# Altium footprint library Module.PcbLib: 48 footprints (part 1 of 3)
Each footprint in its own frame and in the unit in brackets; x right, y up, seen from the top. Pads: shape width x height; smd on the part's side, far side on the other; paste and mask are expansions set on the pad; w line width, h text height; cw(c..) or ccw(c..) is an arc to the next point about the centre after c.
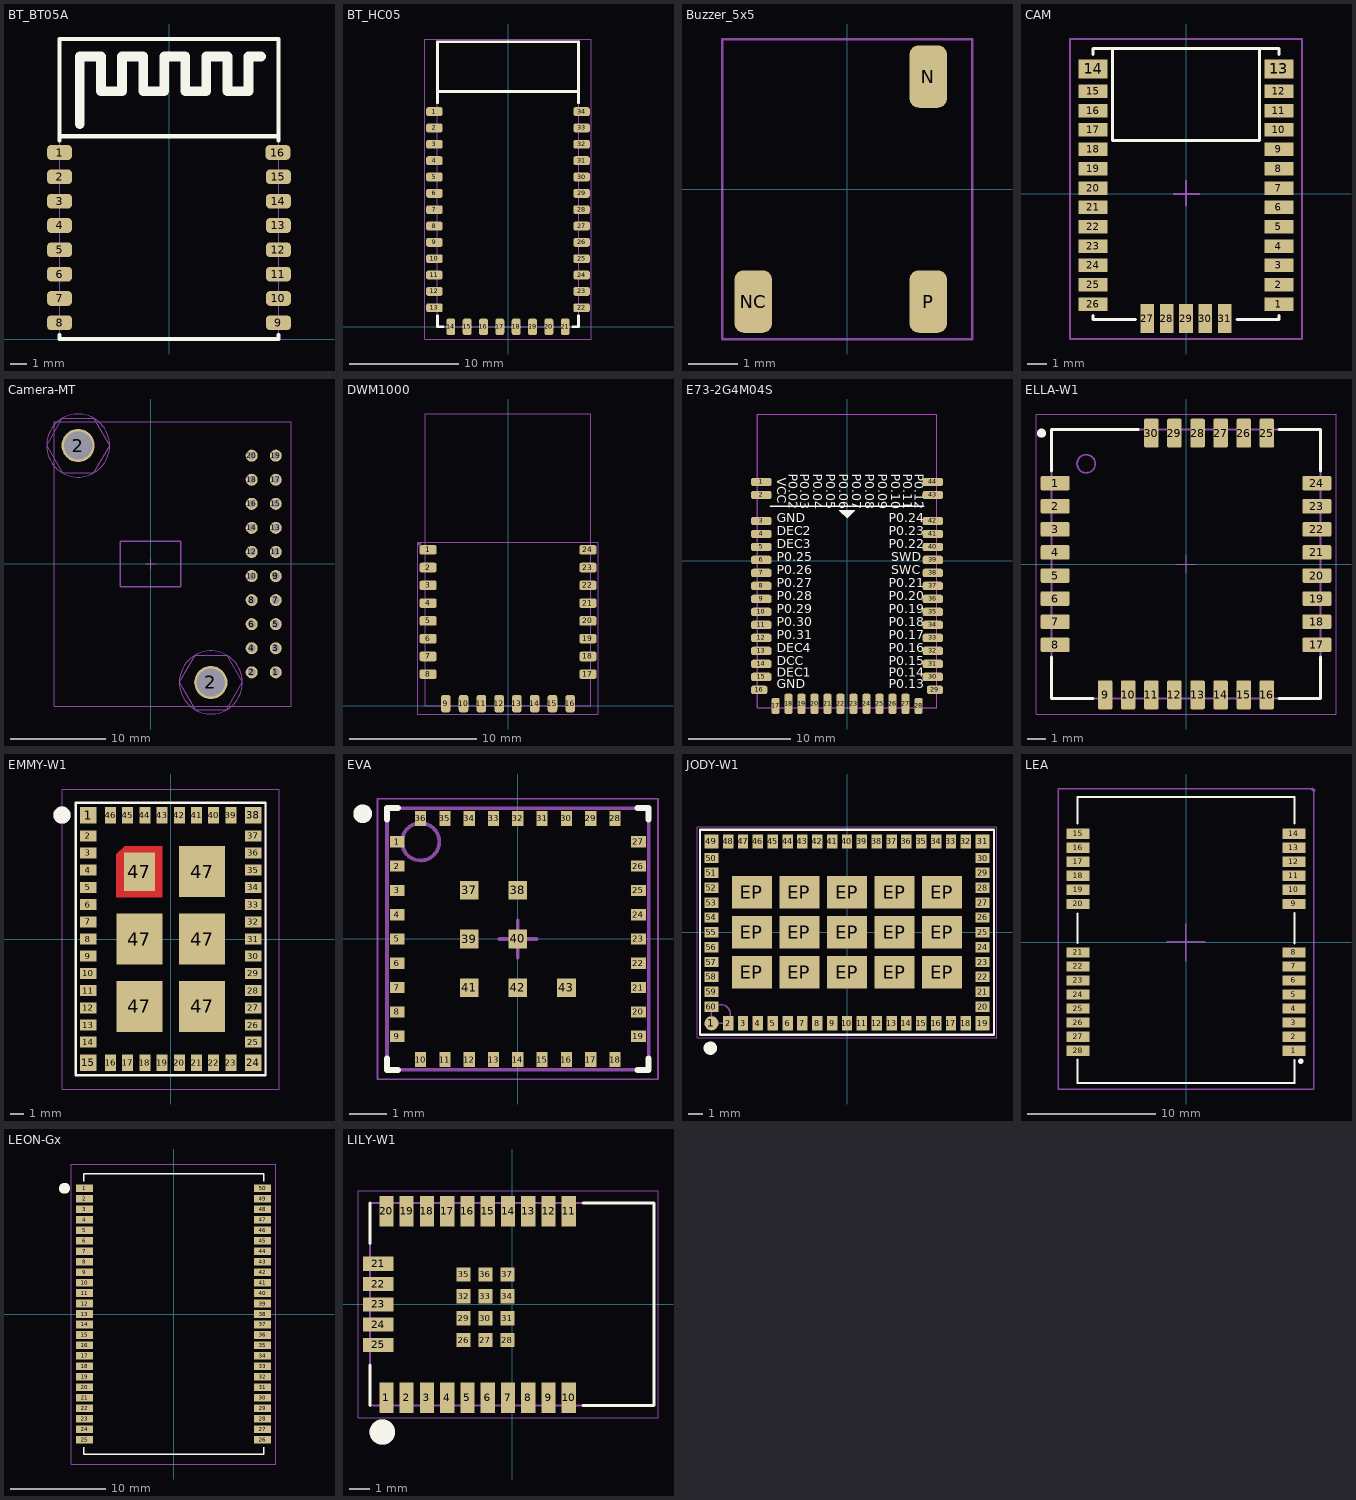
[diagram p0: the footprints below, top view; thin cyan lines are the x and y axes]

## BT_BT05A [mm]
pads (16):
  rrect50% 1.524x0.9 smd: 1(-6.754,11.5) 2(-6.754,10) 3(-6.754,8.5) 4(-6.754,7) 5(-6.754,5.5) 6(-6.754,4) 7(-6.754,2.5) 8(-6.754,1) 9(6.746,1) 10(6.746,2.5) 11(6.746,4) 12(6.746,5.5) 13(6.746,7) 14(6.746,8.5) 15(6.746,10) 16(6.712,11.5)
Top Overlay:
  lines w0.254: -6.75,0.25 -6.75,0 6.75,0 6.75,0.25 ; -6.75,12.25 -6.75,12.5 ; 6.75,12.25 6.75,12.5 ; -6.75,12.5 -6.75,18.5 6.75,18.5 6.75,12.5 ; -6.75,12.5 6.75,12.5
  lines w0.6: -5.5,13.25 -5.5,17.426 -4.2,17.426 -4.2,15.282 -2.9,15.282 -2.9,17.426 -1.6,17.426 -1.6,15.282 -0.3,15.282 -0.3,17.426 1,17.426 1,15.282 2.3,15.282 2.3,17.426 3.6,17.426 3.6,15.282 4.9,15.282 4.9,17.426 5.676,17.426
Mechanical 13:
  lines w0.051: -6.75,12.5 6.75,12.5 ; -6.75,0 6.75,0 6.75,18.5 -6.75,18.5 -6.75,0
T-Component:
  lines w0.051: -6.75,0 6.75,0 6.75,18.5 -6.75,18.5 -6.75,0

## BT_HC05 [mil]
pads (34):
  rrect50% 60x32 smd: 1(-265.91,777.56) 2(-265.91,718.5) 3(-265.91,659.45) 4(-265.91,600.39) 5(-265.91,541.34) 6(-265.91,482.28) 7(-265.91,423.23) 8(-265.91,364.17) 9(-265.91,305.12) 10(-265.91,246.06) 11(-265.91,187.01) 12(-265.91,127.95) 13(-265.91,68.9) 22(265.91,68.9) 23(265.91,127.95) 24(265.91,187.01) 25(265.91,246.06) 26(265.91,305.12) 27(265.91,364.17) 28(265.91,423.23) 29(265.91,482.28) 30(265.91,541.34) 31(265.91,600.39) 32(265.91,659.45) 33(265.91,718.5) 34(265.91,777.56)
  rrect50% 32x60 smd: 14(-206.69,0) 15(-147.64,0) 16(-88.58,0) 17(-29.53,0) 18(29.53,0) 19(88.58,0) 20(147.64,0) 21(206.69,0)
Top Overlay:
  lines w10: -255,40 -255,0 -235,0 ; -255,810 -255,850 ; 235,0 255,0 255,40 ; 255,810 255,850 ; -255,850 255,850 ; -255,850 -255,1030 255,1030 255,850
Mechanical 13:
  lines w2: -255.91,850.39 255.91,850.39 ; -255.91,0 -255.91,1039.37 255.91,1039.37 255.91,0 -255.91,0
T-Component:
  lines w2: -300,-44 -300,1040 300,1040 300,-44 -300,-44
3D body "User Library-Bluetooth HC-06_.STEP": height 92.52, standoff 0, extent -275.98,0 275.98,1102.76

## Buzzer_5x5 [mil]
pads (3):
  rrect50% 30x50 smd: N(65,90) NC(-75,-90) P(65,-90)
T-Component:
  lines w2: -100,-120 -100,120 100,120 100,-120 -100,-120
  text ".Designator" at -39.37,-3.94 h50
3D body "css-0575b-smt.stp": height 106.3, standoff 0, extent -98.44,-98.43 98.41,98.43

## CAM [mm] "u-blox CAM GNSS antenna module"
pads (31):
  rect 1.5x0.7 smd: 1(4.8,-5.7) 2(4.8,-4.7) 3(4.8,-3.7) 4(4.8,-2.7) 5(4.8,-1.7) 6(4.8,-0.7) 7(4.8,0.3) 8(4.8,1.3) 9(4.8,2.3) 10(4.8,3.3) 11(4.8,4.3) 12(4.8,5.3) 15(-4.8,5.3) 16(-4.8,4.3) 17(-4.8,3.3) 18(-4.8,2.3) 19(-4.8,1.3) 20(-4.8,0.3) 21(-4.8,-0.7) 22(-4.8,-1.7) 23(-4.8,-2.7) 24(-4.8,-3.7) 25(-4.8,-4.7) 26(-4.8,-5.7)
  rect 1.5x1 smd: 13(4.8,6.45) 14(-4.8,6.45)
  rect 0.7x1.5 smd: 27(-2,-6.45) 28(-1,-6.45) 29(0,-6.45) 30(1,-6.45) 31(2,-6.45)
Top Overlay:
  lines w0.16: -4.8,-6.3 -4.8,-6.5 -2.6,-6.5 ; -4.8,7.2 -4.8,7.5 4.8,7.5 4.8,7.2 ; -3.8,7.5 -3.8,2.75 3.8,2.75 3.8,7.5 ; 2.63,-6.5 4.45,-6.5 4.8,-6.5 4.8,-6.3
Mechanical 13:
  text ".Designator" at -3.818,9.56 h1
B-Component:
  lines w0.1: -0.619,-0.003 -0.001,-0.003 ; -0.001,-0.615 -0.001,-0.003 ; -0.001,0.662 -0.001,-0.003 ; 0.696,-0.003 -0.001,-0.003 ; -6,-7.5 6,-7.5 6,8 -6,8 -6,-7.5
Multi-Layer:
  pour cut-out: -3.8,7.5 -3.8,2.75 3.8,2.75 3.8,7.5
3D body "CAM (STEP-AP214).STEP": height 1.97, standoff -0.04, extent -4.8,-6.5 4.8,7.5

## Camera-MT [mil]
pads (22):
  round 50 hole 31: 1(520,-450) 2(420,-450) 3(520,-350) 4(420,-350) 5(520,-250) 6(420,-250) 7(520,-150) 8(420,-150) 9(520,-50) 10(420,-50) 11(520,50) 12(420,50) 13(520,150) 14(420,150) 15(520,250) 16(420,250) 17(520,350) 18(420,350) 19(520,450) 20(420,450)
  round 137.8 hole 118.11 mask+0: 2(-300.94,492.13) 2(250.24,-492.13)
Mechanical 13:
  circle w2: c-300.94,492.13 r130.98
  circle w2: c250.24,-492.13 r130.98
  lines w2: -19.69,0 19.68,0 ; 0,-19.69 0,19.68 ; -431.92,492.13 -366.43,605.55 -235.46,605.55 -169.97,492.12 -235.46,378.7 -366.43,378.7 -431.92,492.13 ; -399.37,-590.55 -399.37,590.55 584.88,590.55 584.88,-590.55 -399.37,-590.55 ; 119.26,-492.13 184.75,-378.7 315.72,-378.7 381.21,-492.13 315.72,-605.56 184.75,-605.56 119.26,-492.13
  lines w6: -126,-94 126,-94 126,94 -126,94 -126,-94
B-Component:
  lines w1: 510,-450 530,-450 ; 510,-350 530,-350 ; 510,-250 530,-250 ; 510,-150 530,-150 ; 510,-50 530,-50 ; 510,50 530,50 ; 510,150 530,150 ; 510,250 530,250 ; 510,350 530,350 ; 510,450 530,450 ; 520,-460 520,-440 ; 520,-360 520,-340 ; 520,-260 520,-240 ; 520,-160 520,-140 ; 520,-60 520,-40 ; 520,40 520,60 ; 520,140 520,160 ; 520,240 520,260 ; 520,340 520,360 ; 520,440 520,460
3D body "Camera-MT__Pcb.step": height 528.82, standoff 114.65, extent -399.36,-590.55 584.89,590.55
3D body "female_header_a-bl254-dg-g04d.stp": height 334.65, standoff -125.98, extent 371.57,-4.91 568.42,204.93
3D body "female_header_a-bl254-dg-g06d.stp": height 334.65, standoff -125.98, extent 371.57,195.08 568.42,504.93
3D body "female_header_a-bl254-dg-g06d.stp": height 334.65, standoff -125.98, extent 371.57,-304.92 568.42,4.93
3D body "female_header_a-bl254-dg-g04d.stp": height 334.65, standoff -125.98, extent 371.57,-504.91 568.42,-295.07

## DWM1000 [mil]
pads (24):
  rrect50% 54x30 smd: 1(-248,484.25) 2(-248,429.13) 3(-248,374.02) 4(-248,318.9) 5(-248,263.78) 6(-248,208.66) 7(-248,153.54) 8(-248,98.43) 17(248,98.43) 18(248,153.54) 19(248,208.66) 20(248,263.78) 21(248,318.9) 22(248,374.02) 23(248,429.13) 24(248,484.25)
  rrect50% 30x54 smd: 9(-192.91,7) 10(-137.8,7) 11(-82.68,7) 12(-27.56,7) 13(27.56,7) 14(82.68,7) 15(137.8,7) 16(192.91,7)
Mechanical 13:
  lines w1.97: -255.91,905.51 -255.91,0 255.91,0 255.91,905.51
  lines w2: -255.91,905.51 255.91,905.51
T-Component:
  region: -280,508 -270,508 -270,503 -270,502.01 -270.76,500.17 -272.17,498.76 -274.01,498 -275,498 -280,498
  lines w2: -280,-25 -280,508 280,508 280,-25 -280,-25
  text ".Designator" at -39.37,246.06 h50
3D body "DWM1000 Module.STEP": height 114.17, standoff -0.39, extent -255.9,0 255.9,905.51

## E73-2G4M04S [mil]
pads (44):
  rrect50% 78x32 smd: 1(-330,303.74) 2(-330,253.74) 3(-330,153.74) 4(-330,103.74) 5(-330,53.74) 6(-330,3.74) 7(-330,-46.26) 8(-330,-96.26) 9(-330,-146.26) 10(-330,-196.26) 11(-330,-246.26) 12(-330,-296.26) 13(-330,-346.26) 14(-330,-396.26) 15(-330,-446.26) 30(330,-446.26) 31(330,-396.26) 32(330,-346.26) 33(330,-296.26) 34(330,-246.26) 35(330,-196.26) 36(330,-146.26) 37(330,-96.26) 38(330,-46.26) 39(330,3.74) 40(330,53.74) 41(330,103.74) 42(330,153.74) 43(330,253.74) 44(330,303.74)
  rrect50% 62.99x32 smd: 16(-338,-496.26)
  rrect50% 32x62 smd: 17(-275,-558) 28(275,-558)
  rrect50% 32x78 smd: 18(-225,-550) 19(-175,-550) 20(-125,-550) 21(-75,-550) 22(-25,-550) 23(25,-550) 24(75,-550) 25(125,-550) 26(175,-550) 27(225,-550)
  rrect50% 62x32 smd: 29(338,-496.26)
Top Overlay:
  region: -30,195 30,195 0,165
  lines w2: -30,195 30,195 0,165 -30,195
  lines w6: -295,210 295,210
  text "P0.13" at 160,-502.26 h60
  text "P0.14" at 160,-457.26 h60
  text "P0.15" at 160,-412.26 h60
  text "P0.16" at 160,-362.26 h60
  text "P0.17" at 160,-312.26 h60
  text "P0.18" at 160,-262.26 h60
  text "P0.19" at 160,-212.26 h60
  text "P0.20" at 160,-162.26 h60
  text "P0.21" at 160,-112.26 h60
  text "SWC" at 170,-62.26 h60
  text "SWD" at 170,-12.26 h60
  text "P0.22" at 160,37.74 h60
  text "P0.23" at 160,87.74 h60
  text "P0.24" at 160,137.74 h60
  text "GND" at -270,-502.26 h60
  text "DEC1" at -270,-457.26 h60
  text "DCC" at -270,-412.26 h60
  text "DEC4" at -270,-362.26 h60
  text "P0.31" at -270,-312.26 h60
  text "P0.30" at -270,-262.26 h60
  text "P0.29" at -270,-212.26 h60
  text "P0.28" at -270,-162.26 h60
  text "P0.27" at -270,-112.26 h60
  text "P0.25" at -270,-12.26 h60
  text "DEC3" at -270,37.74 h60
  text "GND" at -270,137.74 h60
  text "DEC2" at -270,87.74 h60
  text "P0.26" at -270,-62.26 h60
  text "P0.02" at -236,335 h60
  text "P0.03" at -191,335 h60
  text "P0.04" at -141,335 h60
  text "P0.05" at -91,335 h60
  text "P0.06" at -41,335 h60
  text "P0.07" at 9,335 h60
  text "P0.08" at 59,335 h60
  text "P0.09" at 109,335 h60
  text "P0.10" at 159,335 h60
  text "P0.11" at 204,335 h60
  text "VCC" at -281,320 h60
  text "P0.12" at 249,335 h60
Keep-Out Layer:
  lines w3.94: -344.49,-564.96 -344.49,564.96 344.49,564.96 344.49,-564.96 -344.49,-564.96
Mechanical 13:
  lines w2: -345,-565 345,-565 345,565 -345,565 -345,-565
T-Component:
  lines w2: -345,-565 -345,565 345,565 345,-565 -345,-565
  text ".Designator" at -40,-5 h50

## ELLA-W1 [mm] "IEEE 802.11a/b/g/n Wi-Fi, Bluetooth 3.0+HS Module"
height 2
pads (30):
  rrect25% 1.6x0.8 smd: 1(-7.2,4.445) 2(-7.2,3.175) 3(-7.2,1.905) 4(-7.2,0.635) 5(-7.2,-0.635) 6(-7.2,-1.905) 7(-7.2,-3.175) 8(-7.2,-4.445) 17(7.2,-4.445) 18(7.2,-3.175) 19(7.2,-1.905) 20(7.2,-0.635) 21(7.2,0.635) 22(7.2,1.905) 23(7.2,3.175) 24(7.2,4.445)
  rrect25% 0.8x1.6 smd: 9(-4.445,-7.2) 10(-3.175,-7.2) 11(-1.905,-7.2) 12(-0.635,-7.2) 13(0.635,-7.2) 14(1.905,-7.2) 15(3.175,-7.2) 16(4.445,-7.2) 25(4.445,7.2) 26(3.175,7.2) 27(1.905,7.2) 28(0.635,7.2) 29(-0.635,7.2) 30(-1.905,7.2)
Top Overlay:
  circle w0.4: c-7.95,7.2 r0.05
  lines w0.16: -7.4,-5.125 -7.4,-7.4 -5.125,-7.4 ; -7.4,5.125 -7.4,7.4 -2.625,7.4 ; 5.125,-7.4 7.4,-7.4 7.4,-5.125 ; 5.125,7.4 7.4,7.4 7.4,5.125
Mechanical 13:
  circle w0.1: c-5.489,5.512 r0.499
  lines w0.1: -7.4,4.695 -7.4,7.4 -2.155,7.4 ccw(c-1.905,7.4) -1.655,7.4 -0.885,7.4 ccw(c-0.635,7.4) -0.385,7.4 0.385,7.4 ccw(c0.635,7.4) 0.885,7.4 1.655,7.4 ccw(c1.905,7.4) 2.155,7.4 2.925,7.4 ccw(c3.175,7.4) 3.425,7.4 4.195,7.4 ccw(c4.445,7.4) 4.695,7.4 ; -7.4,4.695 cw(c-7.4,4.445) -7.4,4.195 -7.4,3.425 cw(c-7.4,3.175) -7.4,2.925 -7.4,2.155 cw(c-7.4,1.905) -7.4,1.655 -7.4,0.885 cw(c-7.4,0.635) -7.4,0.385 -7.4,-0.385 cw(c-7.4,-0.635) -7.4,-0.885 -7.4,-1.655 cw(c-7.4,-1.905) -7.4,-2.155 -7.4,-2.925 cw(c-7.4,-3.175) -7.4,-3.425 -7.4,-4.195 cw(c-7.4,-4.445) -7.4,-4.695 -7.4,-7.4 -4.695,-7.4 cw(c-4.445,-7.4) -4.195,-7.4 -3.425,-7.4 cw(c-3.175,-7.4) -2.925,-7.4 -2.155,-7.4 cw(c-1.905,-7.4) -1.655,-7.4 -0.885,-7.4 cw(c-0.635,-7.4) -0.385,-7.4 0.385,-7.4 cw(c0.635,-7.4) 0.885,-7.4 1.655,-7.4 cw(c1.905,-7.4) 2.155,-7.4 2.925,-7.4 cw(c3.175,-7.4) 3.425,-7.4 4.195,-7.4 cw(c4.445,-7.4) 4.695,-7.4 7.4,-7.4 7.4,-4.695 ; 4.694,7.4 7.4,7.4 7.4,4.695 ccw(c7.4,4.445) 7.4,4.195 7.4,3.425 ccw(c7.4,3.175) 7.4,2.925 7.4,2.155 ccw(c7.4,1.905) 7.4,1.655 7.4,0.885 ccw(c7.4,0.635) 7.4,0.385 7.4,-0.385 ccw(c7.4,-0.635) 7.4,-0.885 7.4,-1.655 ccw(c7.4,-1.905) 7.4,-2.155 7.4,-2.925 ccw(c7.4,-3.175) 7.4,-3.425 7.4,-4.195 ccw(c7.4,-4.445) 7.4,-4.695
  text ".Designator" at -7.4,8.7 h1
B-Component:
  lines w0.05: -0.5,0 0.5,0 ; 0,-0.5 0,0.5 ; -8.25,-8.25 8.25,-8.25 8.25,8.25 -8.25,8.25 -8.25,-8.25
3D body: height 0.87, standoff 0, extent 4.17,7.125 4.72,7.4
3D body: height 0.87, standoff 0.85, extent 4.02,6.975 4.87,7.4
3D body: height 0.87, standoff 0, extent 2.9,7.125 3.45,7.4
3D body: height 0.87, standoff 0.85, extent 2.75,6.975 3.6,7.4
3D body: height 0.87, standoff 0, extent 1.63,7.125 2.18,7.4
3D body: height 0.87, standoff 0.85, extent 1.48,6.975 2.33,7.4
3D body: height 0.87, standoff 0, extent 0.36,7.125 0.91,7.4
3D body: height 0.87, standoff 0.85, extent 0.21,6.975 1.06,7.4
3D body: height 0.87, standoff 0, extent -0.91,7.125 -0.36,7.4
3D body: height 0.87, standoff 0.85, extent -1.06,6.975 -0.21,7.4
3D body: height 0.87, standoff 0, extent -2.18,7.125 -1.63,7.4
3D body: height 0.87, standoff 0.85, extent -2.33,6.975 -1.48,7.4
3D body: height 0.87, standoff 0, extent 7.125,-4.72 7.4,-4.17
3D body: height 0.87, standoff 0.85, extent 6.975,-4.87 7.4,-4.02
3D body: height 0.87, standoff 0, extent 7.125,-3.45 7.4,-2.9
3D body: height 0.87, standoff 0.85, extent 6.975,-3.6 7.4,-2.75
3D body: height 0.87, standoff 0, extent 7.125,-2.18 7.4,-1.63
3D body: height 0.87, standoff 0.85, extent 6.975,-2.33 7.4,-1.48
3D body: height 0.87, standoff 0, extent 7.125,-0.91 7.4,-0.36
3D body: height 0.87, standoff 0.85, extent 6.975,-1.06 7.4,-0.21
3D body: height 0.87, standoff 0, extent 7.125,0.36 7.4,0.91
3D body: height 0.87, standoff 0.85, extent 6.975,0.21 7.4,1.06
3D body: height 0.87, standoff 0, extent 7.125,1.63 7.4,2.18
3D body: height 0.87, standoff 0.85, extent 6.975,1.48 7.4,2.33
3D body: height 0.87, standoff 0, extent 7.125,2.9 7.4,3.45
3D body: height 0.87, standoff 0.85, extent 6.975,2.75 7.4,3.6
3D body: height 0.87, standoff 0, extent 7.125,4.17 7.4,4.72
3D body: height 0.87, standoff 0.85, extent 6.975,4.02 7.4,4.87
3D body: height 0.87, standoff 0, extent -4.72,-7.4 -4.17,-7.125
3D body: height 0.87, standoff 0.85, extent -4.87,-7.4 -4.02,-6.975
3D body: height 0.87, standoff 0, extent -3.45,-7.4 -2.9,-7.125
3D body: height 0.87, standoff 0.85, extent -3.6,-7.4 -2.75,-6.975
3D body: height 0.87, standoff 0, extent -2.18,-7.4 -1.63,-7.125
3D body: height 0.87, standoff 0.85, extent -2.33,-7.4 -1.48,-6.975
3D body: height 0.87, standoff 0, extent -0.91,-7.4 -0.36,-7.125
3D body: height 0.87, standoff 0.85, extent -1.06,-7.4 -0.21,-6.975
3D body: height 0.87, standoff 0, extent 0.36,-7.4 0.91,-7.125
3D body: height 0.87, standoff 0.85, extent 0.21,-7.4 1.06,-6.975
3D body: height 0.87, standoff 0, extent 1.63,-7.4 2.18,-7.125
3D body: height 0.87, standoff 0.85, extent 1.48,-7.4 2.33,-6.975
3D body: height 0.87, standoff 0, extent 2.9,-7.4 3.45,-7.125
3D body: height 0.87, standoff 0.85, extent 2.75,-7.4 3.6,-6.975
3D body: height 0.87, standoff 0, extent 4.17,-7.4 4.72,-7.125
3D body: height 0.87, standoff 0.85, extent 4.02,-7.4 4.87,-6.975
3D body: height 0.87, standoff 0.85, extent -7.4,-4.87 -6.975,-4.02
3D body: height 0.87, standoff 0, extent -7.4,-4.72 -7.125,-4.17
3D body: height 0.87, standoff 0.85, extent -7.4,-3.6 -6.975,-2.75
3D body: height 0.87, standoff 0, extent -7.4,-3.45 -7.125,-2.9
3D body: height 0.87, standoff 0.85, extent -7.4,-2.33 -6.975,-1.48
3D body: height 0.87, standoff 0, extent -7.4,-2.18 -7.125,-1.63
3D body: height 0.87, standoff 0.85, extent -7.4,-1.06 -6.975,-0.21
3D body: height 0.87, standoff 0, extent -7.4,-0.91 -7.125,-0.36
3D body: height 0.87, standoff 0.85, extent -7.4,0.21 -6.975,1.06
3D body: height 0.87, standoff 0, extent -7.4,0.36 -7.125,0.91
3D body: height 0.87, standoff 0.85, extent -7.4,1.48 -6.975,2.33
3D body: height 0.87, standoff 0, extent -7.4,1.63 -7.125,2.18
3D body: height 0.87, standoff 0.85, extent -7.4,2.75 -6.975,3.6
3D body: height 0.87, standoff 0, extent -7.4,2.9 -7.125,3.45
3D body: height 0.87, standoff 0.85, extent -7.4,4.02 -6.975,4.87
3D body: height 0.87, standoff 0, extent -7.4,4.17 -7.125,4.72
3D body: height 0.85, standoff 0, extent -7.4,-7.4 7.4,7.4
3D body: height 2.35, standoff 1.1, extent 7.049,-6.15 7.199,6.15
3D body: height 2.35, standoff 1.1, extent -7.2,-6.15 -7.05,6.15
3D body: height 2.35, standoff 1.1, extent -6.15,-7.2 6.15,-7.05
3D body: height 0.87, standoff 0.85, extent -7.3,-7.3 -6.1,-6.1
3D body: height 2.35, standoff 0.87, extent -7.1,-7.1 -6.2,-6.2
3D body: height 0.87, standoff 0.85, extent 6.1,-7.3 7.3,-6.1
3D body: height 2.35, standoff 0.87, extent 6.2,-7.1 7.1,-6.2
3D body: height 0.87, standoff 0.85, extent 6.099,6.1 7.299,7.3
3D body: height 2.35, standoff 0.87, extent 6.199,6.2 7.099,7.1
3D body: height 2.35, standoff 1.1, extent -6.15,7.05 6.15,7.2
3D body: height 2.35, standoff 0.87, extent -7.1,6.2 -6.2,7.1
3D body: height 0.87, standoff 0.85, extent -7.3,6.1 -6.1,7.3
3D body: height 2.51, standoff 2.5, extent -5.999,5.01 -5.001,6.009
3D body: height 2.5, standoff 2.35, extent -7.2,-7.2 7.199,7.2

## EMMY-W1 [mm] "Host-based multiradio module with Wi-Fi, Bluetooth and NFC"
height 2.5
pads (52):
  rect 1.2x1.2 smd: 1(-6,9) 15(-6,-9) 24(6,-9) 38(6,9)
  rect 1.2x0.8 smd: 2(-6,7.5) 3(-6,6.25) 4(-6,5) 5(-6,3.75) 6(-6,2.5) 7(-6,1.25) 8(-6,0) 9(-6,-1.25) 10(-6,-2.5) 11(-6,-3.75) 12(-6,-5) 13(-6,-6.25) 14(-6,-7.5) 25(6,-7.5) 26(6,-6.25) 27(6,-5) 28(6,-3.75) 29(6,-2.5) 30(6,-1.25) 31(6,0) 32(6,1.25) 33(6,2.5) 34(6,3.75) 35(6,5) 36(6,6.25) 37(6,7.5)
  rect 0.8x1.2 smd: 16(-4.375,-9) 17(-3.125,-9) 18(-1.875,-9) 19(-0.625,-9) 20(0.625,-9) 21(1.875,-9) 22(3.125,-9) 23(4.375,-9) 39(4.375,9) 40(3.125,9) 41(1.875,9) 42(0.625,9) 43(-0.625,9) 44(-1.875,9) 45(-3.125,9) 46(-4.375,9)
  rect 3.35x3.7 smd paste-10: 47(-2.275,-4.9) 47(-2.275,0) 47(2.275,-4.9) 47(2.275,0) 47(2.275,4.9)
  rect 2.25x2.8 smd paste-10: 47(-2.275,4.9)
Top Layer:
  region: -3.95,3.05 -0.6,3.05 -0.6,6.75 -3.35,6.75 -3.95,6.15
Top Overlay:
  circle w0.75: c-7.9,9 r0.25
  lines w0.15: -6.9,-9.9 6.9,-9.9 6.9,9.9 -6.9,9.9 -6.9,-9.9
Top Paste:
  drawing of 54 lines, arcs and shapes, not listed
Top Solder:
  region: -4.075,2.95 -0.5,2.95 -0.5,6.85 -3.425,6.85 -4.075,6.2
Mechanical 13:
  circle w0.75: c-7.9,9 r0.25
  lines w0.1: -6.9,-9.9 6.9,-9.9 6.9,9.9 -6.9,9.9 -6.9,-9.9
  text ".Designator" at -6.9,11.4 h1
B-Component:
  lines w0.05: -7.9,-10.9 7.9,-10.9 7.9,10.9 -7.9,10.9 -7.9,-10.9
3D body: height 3, standoff 0, extent -6.925,-9.9 6.925,9.9

## ESP03 [mm]
3D body "User Library-ESP-03.STEP": height 2.32, standoff -1.12, extent -0.05,0 12.25,17.3

## ESP07 [mm]
3D body "User Library-WiFi ESP8266.STEP": height 3.6, standoff -0.05, extent 0.5,0.5 16.5,21.7

## EVA [mm] "u-blox EVA GNSS module"
height 1.16
pads (43):
  rect 0.4x0.3 smd: 1(-3.225,2.6) 2(-3.225,1.95) 3(-3.225,1.3) 4(-3.225,0.65) 5(-3.225,0) 6(-3.225,-0.65) 7(-3.225,-1.3) 8(-3.225,-1.95) 9(-3.225,-2.6) 19(3.225,-2.6) 20(3.225,-1.95) 21(3.225,-1.3) 22(3.225,-0.65) 23(3.225,0) 24(3.225,0.65) 25(3.225,1.3) 26(3.225,1.95) 27(3.225,2.6)
  rect 0.3x0.4 smd: 10(-2.6,-3.225) 11(-1.95,-3.225) 12(-1.3,-3.225) 13(-0.65,-3.225) 14(0,-3.225) 15(0.65,-3.225) 16(1.3,-3.225) 17(1.95,-3.225) 18(2.6,-3.225) 28(2.6,3.225) 29(1.95,3.225) 30(1.3,3.225) 31(0.65,3.225) 32(0,3.225) 33(-0.65,3.225) 34(-1.3,3.225) 35(-1.95,3.225) 36(-2.6,3.225)
  rect 0.5x0.5 smd paste+0: 37(-1.3,1.3) 38(0,1.3) 39(-1.3,0) 40(0,0) 41(-1.3,-1.3) 42(0,-1.3) 43(1.3,-1.3)
Top Overlay:
  circle w0.25: c-4.15,3.35 r0.125
  lines w0.16: -3.5,-3.2 -3.5,-3.5 -3.2,-3.5 ; -3.5,3.2 -3.5,3.5 -3.2,3.5 ; 3.2,-3.5 3.5,-3.5 3.5,-3.2 ; 3.2,3.5 3.5,3.5 3.5,3.2
Mechanical 13:
  circle w0.1: c-2.6,2.6 r0.5
  lines w0.1: -3.5,-3.5 3.5,-3.5 3.5,3.5 -3.5,3.5 -3.5,-3.5
  text ".Designator" at -3.291,4.285 h1
B-Component:
  lines w0.05: -3.75,-3.75 3.75,-3.75 3.75,3.75 -3.75,3.75 -3.75,-3.75
  lines w0.1: -0.5,0 0.5,0 ; 0,-0.5 0,0.5
3D body "EVA-43 (STEP-AP214).STEP": height 1.07, standoff 0.01, extent -3.499,-3.499 3.501,3.501

## JODY-W1 [mm] "Host-based modules with Wi-Fi and dual-mode Bluetooth"
height 2.5
pads (75):
  round 0.95 smd: 1(-9.125,-6.125)
  rect 0.7x0.95 smd: 2(-8,-6.125) 3(-7,-6.125) 4(-6,-6.125) 5(-5,-6.125) 6(-4,-6.125) 7(-3,-6.125) 8(-2,-6.125) 9(-1,-6.125) 10(0,-6.125) 12(2,-6.125) 13(3,-6.125) 14(4,-6.125) 15(5,-6.125) 17(7,-6.125) 18(8,-6.125) 32(8,6.125) 33(7,6.125) 34(6,6.125) 35(5,6.125) 36(4,6.125) 37(3,6.125) 38(2,6.125) 39(1,6.125) 40(0,6.125) 41(-1,6.125) 42(-2,6.125) 43(-3,6.125) 44(-4,6.125) 45(-5,6.125) 46(-6,6.125) 47(-7,6.125) 48(-8,6.125)
  rect 0.7x0.95 smd paste+0: 11(1,-6.125) 16(6,-6.125)
  rect 0.95x0.95 smd: 19(9.125,-6.125) 31(9.125,6.125) 49(-9.125,6.125)
  rect 0.95x0.7 smd: 20(9.125,-5) 21(9.125,-4) 22(9.125,-3) 23(9.125,-2) 24(9.125,-1) 25(9.125,0) 26(9.125,1) 27(9.125,2) 28(9.125,3) 29(9.125,4) 30(9.125,5) 50(-9.125,5) 51(-9.125,4) 52(-9.125,3) 53(-9.125,2) 54(-9.125,1) 55(-9.125,0) 56(-9.125,-1) 57(-9.125,-2) 58(-9.125,-3) 59(-9.125,-4) 60(-9.125,-5)
  rect 2.7x2.2 smd paste-10: EP(-6.4,-2.7) EP(-6.4,0) EP(-6.4,2.7) EP(-3.2,-2.7) EP(-3.2,2.7) EP(-3.2,0) EP(0,-2.7) EP(0,0) EP(0,2.7) EP(3.2,-2.7) EP(3.2,0) EP(3.2,2.7) EP(6.4,2.7) EP(6.4,-2.7) EP(6.4,0)
Top Overlay:
  circle w0.5: c-9.202,-7.8 r0.202
  lines w0.15: -9.9,-6.9 -9.9,6.9 9.9,6.9 9.9,-6.9 -9.9,-6.9
Top Paste:
  rectangle: -7.525,-2.575 -6.525,-1.775
  rectangle: -6.275,-2.575 -5.275,-1.775
  rectangle: -7.525,-3.625 -6.525,-2.825
  rectangle: -6.275,-3.625 -5.275,-2.825
  rectangle: -7.525,0.125 -6.525,0.925
  rectangle: -6.275,0.125 -5.275,0.925
  rectangle: -7.525,-0.925 -6.525,-0.125
  rectangle: -6.275,-0.925 -5.275,-0.125
  rectangle: -4.325,-2.575 -3.325,-1.775
  rectangle: -3.075,-2.575 -2.075,-1.775
  rectangle: -4.325,-3.625 -3.325,-2.825
  rectangle: -3.075,-3.625 -2.075,-2.825
  rectangle: -4.325,0.125 -3.325,0.925
  rectangle: -3.075,0.125 -2.075,0.925
  rectangle: -4.325,-0.925 -3.325,-0.125
  rectangle: -3.075,-0.925 -2.075,-0.125
  rectangle: -1.125,-2.575 -0.125,-1.775
  rectangle: 0.125,-2.575 1.125,-1.775
  rectangle: -1.125,-3.625 -0.125,-2.825
  rectangle: 0.125,-3.625 1.125,-2.825
  rectangle: -1.125,0.125 -0.125,0.925
  rectangle: 0.125,0.125 1.125,0.925
  rectangle: -1.125,-0.925 -0.125,-0.125
  rectangle: 0.125,-0.925 1.125,-0.125
  rectangle: 2.075,0.125 3.075,0.925
  rectangle: 3.325,0.125 4.325,0.925
  rectangle: 2.075,-0.925 3.075,-0.125
  rectangle: 3.325,-0.925 4.325,-0.125
  rectangle: 2.075,-2.575 3.075,-1.775
  rectangle: 3.325,-2.575 4.325,-1.775
  rectangle: 2.075,-3.625 3.075,-2.825
  rectangle: 3.325,-3.625 4.325,-2.825
  rectangle: 5.275,-2.575 6.275,-1.775
  rectangle: 6.525,-2.575 7.525,-1.775
  rectangle: 5.275,-3.625 6.275,-2.825
  rectangle: 6.525,-3.625 7.525,-2.825
  rectangle: 5.275,0.125 6.275,0.925
  rectangle: 6.525,0.125 7.525,0.925
  rectangle: 5.275,-0.925 6.275,-0.125
  rectangle: 6.525,-0.925 7.525,-0.125
  rectangle: 5.275,2.825 6.275,3.625
  rectangle: 6.525,2.825 7.525,3.625
  rectangle: 5.275,1.775 6.275,2.575
  rectangle: 6.525,1.775 7.525,2.575
  rectangle: 2.075,2.825 3.075,3.625
  rectangle: 3.325,2.825 4.325,3.625
  rectangle: 2.075,1.775 3.075,2.575
  rectangle: 3.325,1.775 4.325,2.575
  rectangle: -1.125,2.825 -0.125,3.625
  rectangle: 0.125,2.825 1.125,3.625
  rectangle: -1.125,1.775 -0.125,2.575
  rectangle: 0.125,1.775 1.125,2.575
  rectangle: -4.325,2.825 -3.325,3.625
  rectangle: -3.075,2.825 -2.075,3.625
  rectangle: -4.325,1.775 -3.325,2.575
  rectangle: -3.075,1.775 -2.075,2.575
  rectangle: -7.525,2.825 -6.525,3.625
  rectangle: -6.275,2.825 -5.275,3.625
  rectangle: -7.525,1.775 -6.525,2.575
  rectangle: -6.275,1.775 -5.275,2.575
Mechanical 13:
  circle w0.1: c-8.5,-5.5 r0.632
  lines w0.1: -9.9,-6.9 -9.9,6.9 9.9,6.9 9.9,-6.9 -9.9,-6.9
  text ".Designator" at -3.625,-0.325 h1
B-Component:
  lines w0.05: -10.1,-7.1 -10.1,7.1 10.1,7.1 10.1,-7.1 -10.1,-7.1
  lines w0.1: -1,0 1,0 ; 0,-1 0,1
3D body "JODY.STEP": height 2.43, standoff 0.02, extent -9.9,-6.9 9.9,6.9

## LEA [mm] "u-blox LEA GNSS module"
pads (28):
  rect 1.8x0.8 smd paste-4: 1(8.445,-8.5)
  rect 1.8x0.8 smd paste-0.4 mask+0.102: 2(8.445,-7.4) 3(8.445,-6.3) 4(8.445,-5.2) 5(8.445,-4.1) 6(8.445,-3) 7(8.445,-1.9) 8(8.445,-0.8) 9(8.445,3) 10(8.445,4.1) 11(8.445,5.2) 12(8.445,6.3) 13(8.445,7.4) 14(8.445,8.5) 16(-8.445,7.4) 17(-8.445,6.3) 18(-8.445,5.2) 19(-8.445,4.1) 20(-8.445,3) 21(-8.445,-0.8) 22(-8.445,-1.9) 23(-8.445,-3) 24(-8.445,-4.1) 25(-8.445,-5.2) 26(-8.445,-6.3) 27(-8.445,-7.4) 28(-8.445,-8.5)
  rect 1.8x0.8 smd paste-0.4: 15(-8.445,8.5)
Top Overlay:
  circle w0.38: c8.999,-9.325 r0.026
  lines w0.16: -8.514,9.28 -8.514,11.344 -8.495,11.363 8.497,11.363 8.497,9.28 ; -8.508,-0.08 -8.508,2.238 ; -8.501,-9.198 -8.501,-11.027 -8.489,-11.04 8.485,-11.04 8.497,-11.027 8.497,-9.237 ; 8.485,-0.093 8.485,2.276
Top Paste:
  rectangle: 8.496,-8.9 9.596,-8.1
  rectangle: 8.496,-7.8 9.596,-7
  rectangle: 8.496,-6.7 9.596,-5.9
  rectangle: 8.496,-5.6 9.596,-4.8
  rectangle: 8.496,-4.5 9.596,-3.7
  rectangle: 8.496,-3.4 9.596,-2.6
  rectangle: 8.496,-2.3 9.596,-1.5
  rectangle: 8.496,-1.2 9.596,-0.4
  rectangle: 8.495,2.6 9.596,3.4
  rectangle: 8.495,3.7 9.596,4.5
  rectangle: 8.495,5.9 9.596,6.7
  rectangle: 8.495,7 9.596,7.8
  rectangle: 8.495,8.1 9.596,8.9
  rectangle: 8.495,4.8 9.596,5.6
  rectangle: 7.845,-8.8 8.495,-8.2
  rectangle: 7.845,-6.6 8.495,-6
  rectangle: 7.845,-5.5 8.495,-4.9
  rectangle: 7.845,-4.4 8.495,-3.8
  rectangle: 7.845,-3.3 8.495,-2.7
  rectangle: 7.845,-2.2 8.495,-1.6
  rectangle: 7.845,-1.1 8.495,-0.5
  rectangle: 7.845,2.7 8.495,3.3
  rectangle: 7.845,3.8 8.495,4.4
  rectangle: 7.845,4.9 8.495,5.5
  rectangle: 7.845,6 8.495,6.6
  rectangle: 7.845,8.2 8.495,8.8
  rectangle: 7.845,7.1 8.495,7.7
  rectangle: 7.845,-7.7 8.495,-7.1
  rectangle: -9.604,4.8 -8.504,5.6
  rectangle: -9.604,8.1 -8.504,8.9
  rectangle: -9.604,7 -8.504,7.8
  rectangle: -9.604,5.9 -8.504,6.7
  rectangle: -9.604,3.7 -8.504,4.5
  rectangle: -9.604,2.6 -8.504,3.4
  rectangle: -8.504,7.1 -7.854,7.7
  rectangle: -8.504,8.2 -7.854,8.8
  rectangle: -8.504,6 -7.854,6.6
  rectangle: -8.504,4.9 -7.854,5.5
  rectangle: -8.504,3.8 -7.854,4.4
  rectangle: -8.504,2.7 -7.854,3.3
  rectangle: -9.604,-1.2 -8.504,-0.4
  rectangle: -9.604,-2.3 -8.504,-1.5
  rectangle: -9.604,-3.4 -8.504,-2.6
  rectangle: -9.604,-4.5 -8.504,-3.7
  rectangle: -9.604,-5.6 -8.504,-4.8
  rectangle: -9.604,-6.7 -8.504,-5.9
  rectangle: -9.604,-7.8 -8.504,-7
  rectangle: -9.604,-8.9 -8.504,-8.1
  rectangle: -8.505,-7.7 -7.855,-7.1
  rectangle: -8.505,-1.1 -7.855,-0.5
  rectangle: -8.505,-2.2 -7.855,-1.6
  rectangle: -8.505,-3.3 -7.855,-2.7
  rectangle: -8.505,-4.4 -7.855,-3.8
  rectangle: -8.505,-5.5 -7.855,-4.9
  rectangle: -8.505,-6.6 -7.855,-6
  rectangle: -8.505,-8.8 -7.855,-8.2
Mechanical 13:
  text ".Designator" at -6.65,12.659 h1
B-Component:
  lines w0.1: -1.5,0.019 -0.001,0.019 ; -0.001,-1.5 -0.001,0.019 ; -0.001,1.464 -0.001,0.019 ; 1.5,0.019 -0.001,0.019 ; 9.9,12 -10,12 -10,-11.5 10,-11.5 10,11.9
  lines w0.254: 9.9,12 10,11.9
3D body "LEA ( STEP-AP214).STEP": height 2.35, standoff -0.05, extent -8.502,-11.015 8.498,11.385

## LEON-Gx [mm] "quad-band GSM/GPRS data & voice module"
height 3.3
pads (50):
  rrect5% 1.8x0.8 smd paste-1: 1(-9.35,13.2) 2(-9.35,12.1) 3(-9.35,11) 4(-9.35,9.9) 5(-9.35,8.8) 6(-9.35,7.7) 7(-9.35,6.6) 8(-9.35,5.5) 9(-9.35,4.4) 10(-9.35,3.3) 11(-9.35,2.2) 12(-9.35,1.1) 13(-9.35,0) 14(-9.35,-1.1) 15(-9.35,-2.2) 16(-9.35,-3.3) 17(-9.35,-4.4) 18(-9.35,-5.5) 19(-9.35,-6.6) 20(-9.35,-7.7) 21(-9.35,-8.8) 22(-9.35,-9.9) 23(-9.35,-11) 24(-9.35,-12.1) 25(-9.35,-13.2) 26(9.35,-13.2) 27(9.35,-12.1) 28(9.35,-11) 29(9.35,-9.9) 30(9.35,-8.8) 31(9.35,-7.7) 32(9.35,-6.6) 33(9.35,-5.5) 34(9.35,-4.4) 35(9.35,-3.3) 36(9.35,-2.2) 37(9.35,-1.1) 38(9.35,0) 39(9.35,1.1) 40(9.35,2.2) 41(9.35,3.3) 42(9.35,4.4) 43(9.35,5.5) 44(9.35,6.6) 45(9.35,7.7) 46(9.35,8.8) 47(9.35,9.9) 48(9.35,11) 49(9.35,12.1) 50(9.35,13.2)
Top Overlay:
  circle w0.635: c-11.454,13.2 r0.254
  lines w0.15: -9.45,-14 -9.45,-14.75 9.45,-14.75 9.45,-14 ; -9.45,13.95 -9.45,14.75 9.45,14.75 9.45,13.95
Top Paste:
  rectangle: 8.55,12.9 9.45,13.5
  rectangle: 8.55,11.8 9.45,12.4
  rectangle: 8.55,9.6 9.45,10.2
  rectangle: 8.55,10.7 9.45,11.3
  rectangle: 8.55,8.5 9.45,9.1
  rectangle: 8.55,7.4 9.45,8
  rectangle: 8.55,5.2 9.45,5.8
  rectangle: 8.55,6.3 9.45,6.9
  rectangle: 8.55,4.1 9.45,4.7
  rectangle: 8.55,3 9.45,3.6
  rectangle: 8.55,0.8 9.45,1.4
  rectangle: 8.55,1.9 9.45,2.5
  rectangle: 8.55,-0.3 9.45,0.3
  rectangle: 8.55,-1.4 9.45,-0.8
  rectangle: 8.55,-3.6 9.45,-3
  rectangle: 8.55,-2.5 9.45,-1.9
  rectangle: 8.55,-4.7 9.45,-4.1
  rectangle: 8.55,-5.8 9.45,-5.2
  rectangle: 8.55,-8 9.45,-7.4
  rectangle: 8.55,-6.9 9.45,-6.3
  rectangle: 8.55,-9.1 9.45,-8.5
  rectangle: 8.55,-10.2 9.45,-9.6
  rectangle: 8.55,-12.4 9.45,-11.8
  rectangle: 8.55,-11.3 9.45,-10.7
  rectangle: 8.55,-13.5 9.45,-12.9
  rectangle: -9.45,-13.5 -8.55,-12.9
  rectangle: -9.45,-9.1 -8.55,-8.5
  rectangle: -9.45,-11.3 -8.55,-10.7
  rectangle: -9.45,-10.2 -8.55,-9.6
  rectangle: -9.45,-12.4 -8.55,-11.8
  rectangle: -9.45,-4.7 -8.55,-4.1
  rectangle: -9.45,-6.9 -8.55,-6.3
  rectangle: -9.45,-5.8 -8.55,-5.2
  rectangle: -9.45,-8 -8.55,-7.4
  rectangle: -9.45,-0.3 -8.55,0.3
  rectangle: -9.45,-2.5 -8.55,-1.9
  rectangle: -9.45,-1.4 -8.55,-0.8
  rectangle: -9.45,-3.6 -8.55,-3
  rectangle: -9.45,4.1 -8.55,4.7
  rectangle: -9.45,1.9 -8.55,2.5
  rectangle: -9.45,3 -8.55,3.6
  rectangle: -9.45,0.8 -8.55,1.4
  rectangle: -9.45,8.5 -8.55,9.1
  rectangle: -9.45,6.3 -8.55,6.9
  rectangle: -9.45,7.4 -8.55,8
  rectangle: -9.45,5.2 -8.55,5.8
  rectangle: -9.45,9.6 -8.55,10.2
  rectangle: -9.45,11.8 -8.55,12.4
  rectangle: -9.45,10.7 -8.55,11.3
  rectangle: -9.45,12.9 -8.55,13.5
  rectangle: 9.45,11.7 10.65,12.5
  rectangle: 9.45,10.6 10.65,11.4
  rectangle: 9.45,9.5 10.65,10.3
  rectangle: 9.45,8.4 10.65,9.2
  rectangle: 9.45,7.3 10.65,8.1
  rectangle: 9.45,6.2 10.65,7
  rectangle: 9.45,5.1 10.65,5.9
  rectangle: 9.45,4 10.65,4.8
  rectangle: 9.45,2.9 10.65,3.7
  rectangle: 9.45,1.8 10.65,2.6
  rectangle: 9.45,0.7 10.65,1.5
  rectangle: 9.45,-0.4 10.65,0.4
  rectangle: 9.45,-1.5 10.65,-0.7
  rectangle: 9.45,-2.6 10.65,-1.8
  rectangle: 9.45,-3.7 10.65,-2.9
  rectangle: 9.45,-4.8 10.65,-4
  rectangle: 9.45,-5.9 10.65,-5.1
  rectangle: 9.45,-7 10.65,-6.2
  rectangle: 9.45,-8.1 10.65,-7.3
  rectangle: 9.45,-9.2 10.65,-8.4
  rectangle: 9.45,-10.3 10.65,-9.5
  rectangle: 9.45,-11.4 10.65,-10.6
  rectangle: 9.45,-12.5 10.65,-11.7
  rectangle: 9.45,-13.6 10.65,-12.8
  rectangle: -10.65,-8.1 -9.45,-7.3
  rectangle: -10.65,-9.2 -9.45,-8.4
  rectangle: -10.65,-10.3 -9.45,-9.5
  rectangle: -10.65,-11.4 -9.45,-10.6
  rectangle: -10.65,-12.5 -9.45,-11.7
  rectangle: -10.65,-13.6 -9.45,-12.8
  rectangle: -10.65,-7 -9.45,-6.2
  rectangle: -10.65,-5.9 -9.45,-5.1
  rectangle: -10.65,-4.8 -9.45,-4
  rectangle: -10.65,-3.7 -9.45,-2.9
  rectangle: -10.65,-2.6 -9.45,-1.8
  rectangle: -10.65,-1.5 -9.45,-0.7
  rectangle: -10.65,-0.4 -9.45,0.4
  rectangle: -10.65,0.7 -9.45,1.5
  rectangle: -10.65,1.8 -9.45,2.6
  rectangle: -10.65,2.9 -9.45,3.7
  rectangle: -10.65,4 -9.45,4.8
  rectangle: -10.65,5.1 -9.45,5.9
  rectangle: -10.65,6.2 -9.45,7
  rectangle: -10.65,7.3 -9.45,8.1
  rectangle: -10.65,8.4 -9.45,9.2
  rectangle: -10.65,9.5 -9.45,10.3
  rectangle: -10.65,10.6 -9.45,11.4
  rectangle: -10.65,11.7 -9.45,12.5
  rectangle: 9.45,12.8 10.65,13.6
  rectangle: -10.65,12.8 -9.45,13.6
Mechanical 13:
  text ".Designator" at -9.45,16.25 h1
B-Component:
  lines w0.05: -10.75,-15.75 -10.75,15.75 10.75,15.75 10.75,-15.75 -10.75,-15.75
3D body: height 3.2, standoff 0.9, extent -8.95,-14.2 8.95,14.25
3D body: height 0.9, standoff 0, extent -9.45,-14.75 9.45,14.75
3D body: height 3.3, standoff 3.2, extent -8.575,-13.825 8.575,13.875

## LILY-W1 [mm] "Host-based Wi-Fi module"
height 4.14
pads (37):
  rect 0.7x1.5 smd paste+0 mask+0.05: 1(-6.2,-4.6) 2(-5.2,-4.6) 3(-4.2,-4.6) 4(-3.2,-4.6) 5(-2.2,-4.6) 6(-1.2,-4.6) 7(-0.2,-4.6) 8(0.8,-4.6) 9(1.8,-4.6) 10(2.8,-4.6) 11(2.8,4.6) 12(1.8,4.6) 13(0.8,4.6) 14(-0.2,4.6) 15(-1.2,4.6) 16(-2.2,4.6) 17(-3.2,4.6) 18(-4.2,4.6) 19(-5.2,4.6) 20(-6.2,4.6)
  rect 1.5x0.7 smd paste+0 mask+0.05: 21(-6.6,2) 22(-6.6,1) 23(-6.6,0) 24(-6.6,-1) 25(-6.6,-2)
  rect 0.7x0.7 smd paste+0 mask+0.05: 26(-2.39,-1.76) 27(-1.31,-1.76) 28(-0.23,-1.76) 29(-2.39,-0.68) 30(-1.31,-0.68) 31(-0.23,-0.68) 32(-2.39,0.4) 33(-1.31,0.4) 34(-0.23,0.4) 35(-2.39,1.48) 36(-1.31,1.48) 37(-0.23,1.48)
Top Overlay:
  circle w0.75: c-6.4,-6.3 r0.25
  lines w0.15: -7,-5 -7,-3 ; -7,3 -7,5 ; 3.5,-5 7,-5 7,5 3.5,5
Mechanical 13:
  circle w0.75: c-6.4,-6.3 r0.25
  lines w0.1: -7,-5 7,-5 7,5 -7,5 -7,-5
  text ".Designator" at -7,6 h1
B-Component:
  lines w0.05: -7.6,-5.6 7.2,-5.6 7.2,5.6 -7.6,5.6 -7.6,-5.6
3D body: height 4.14, standoff 0, extent 3.2,-5 7,5
3D body: height 2.54, standoff 0.05, extent -7,-5 3.2,5